# Altium footprint library LC-Standard-FootPrints-AD-V1.01.PcbLib: 585 footprints (part 1 of 37)
Each footprint in its own frame and in the unit in brackets; x right, y up, seen from the top. Pads: shape width x height; smd on the part's side, far side on the other; paste and mask are expansions set on the pad; w line width, h text height; cw(c..) or ccw(c..) is an arc to the next point about the centre after c.
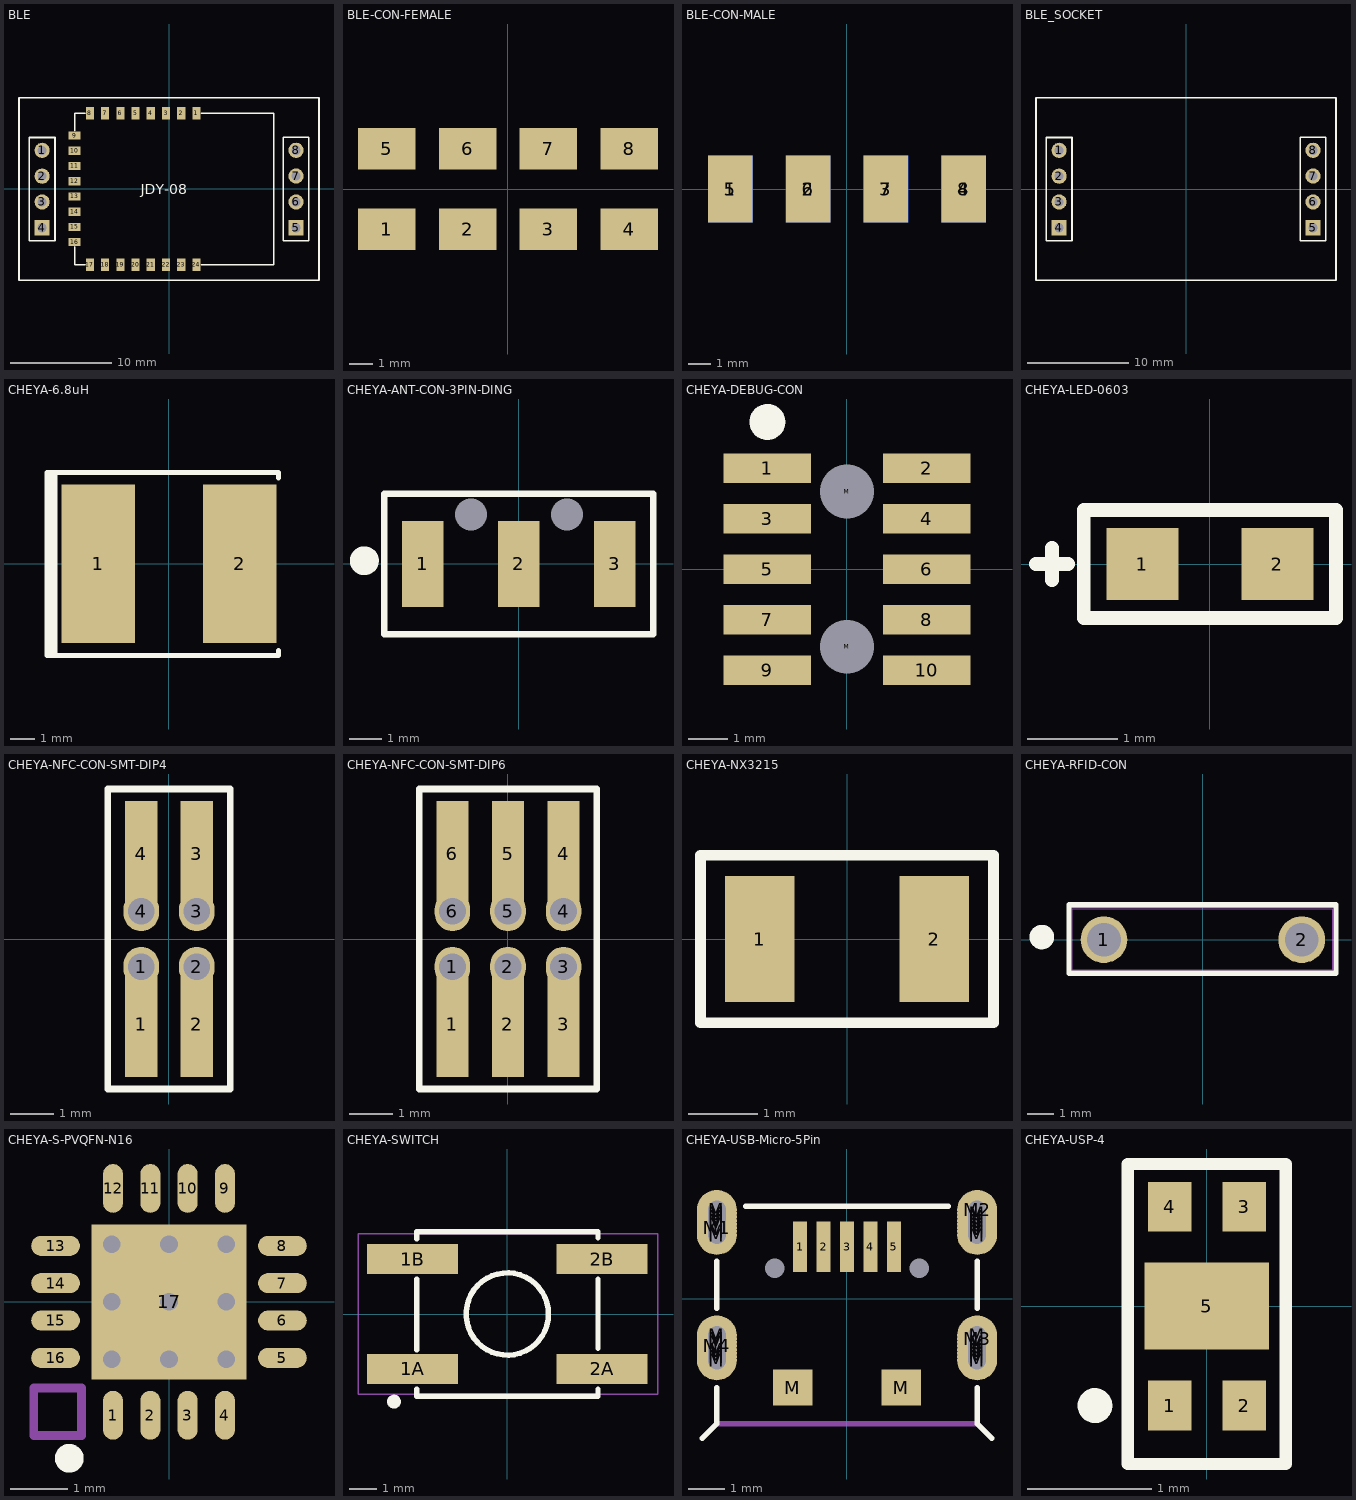
[diagram p0: the footprints below, top view; thin cyan lines are the x and y axes]

## BLE [mm]
pads (32):
  round 1.5 hole 0.9: 1(-12.504,3.804) 2(-12.504,1.264) 3(-12.504,-1.276) 6(12.504,-1.27) 7(12.504,1.27) 8(12.504,3.81)
  rect 0.8x1.2 smd: 1(2.696,7.468) 2(1.196,7.468) 3(-0.304,7.468) 4(-1.804,7.468) 5(-3.304,7.468) 6(-4.804,7.468) 7(-6.304,7.468) 8(-7.804,7.468) 17(-7.804,-7.468) 18(-6.304,-7.468) 19(-4.804,-7.468) 20(-3.304,-7.468) 21(-1.804,-7.468) 22(-0.304,-7.468) 23(1.196,-7.468) 24(2.696,-7.468)
  rect 1.5x1.5 hole 0.9: 4(-12.504,-3.816) 5(12.504,-3.81)
  rect 1.2x0.8 smd: 9(-9.304,5.265) 10(-9.304,3.765) 11(-9.304,2.265) 12(-9.304,0.765) 13(-9.304,-0.735) 14(-9.304,-2.235) 15(-9.304,-3.735) 16(-9.304,-5.235)
Top Overlay:
  lines w0.152: -14.781,-8.968 10.311,-8.968 14.723,-8.968 ; -14.781,-8.959 -14.781,5.074 -14.781,8.968 10.311,8.968 14.758,8.968 14.758,5.073 14.758,-8.968
  lines w0.16: -9.304,-5.709 -9.304,-7.468 -8.288,-7.468 ; -9.304,5.766 -9.304,7.468 -8.288,7.468 ; 3.162,-7.468 3.885,-7.468 10.311,-7.468 10.311,5.563 10.311,7.468 5.256,7.468 3.162,7.468 ; -13.781,-5.086 -13.781,5.074 -11.241,5.074 -11.241,-5.086 -13.781,-5.086 ; 11.226,-5.08 13.766,-5.08 13.766,5.08 11.226,5.08 11.226,-5.08
  text "JDY-08" at -2.804,-0.506 h1

## BLE-CON-FEMALE [mm]
pads (8):
  rect 2.5x1.8 smd: 1(-5.25,-1.75) 2(-1.75,-1.75) 3(1.75,-1.75) 4(5.25,-1.75) 5(-5.25,1.75) 6(-1.75,1.75) 7(1.75,1.75) 8(5.25,1.75)

## BLE-CON-MALE [mm]
pads (8):
  rect 2x3 smd: 1(-5.25,0) 2(-1.75,0) 3(1.75,0) 4(5.25,0)
  rect 2x3 smd far side: 5(-5.25,0) 6(-1.75,0) 7(1.75,0) 8(5.25,0)

## BLE_SOCKET [mm]
pads (8):
  round 1.5 hole 0.9: 1(-12.504,3.807) 2(-12.504,1.267) 3(-12.504,-1.273) 6(12.504,-1.267) 7(12.504,1.273) 8(12.504,3.813)
  rect 1.5x1.5 hole 0.9: 4(-12.504,-3.813) 5(12.504,-3.807)
Top Overlay:
  lines w0.16: -14.781,-8.965 10.311,-8.965 14.723,-8.965 ; -14.781,-8.957 -14.781,5.077 -14.781,8.97 10.311,8.97 14.758,8.97 14.758,5.076 14.758,-8.965 ; -13.781,-5.083 -13.781,5.077 -11.241,5.077 -11.241,-5.083 -13.781,-5.083 ; 11.226,-5.077 13.766,-5.077 13.766,5.083 11.226,5.083 11.226,-5.077

## CHEYA-6.8uH [mm]
pads (2):
  rect 3x6.5 smd: 1(-2.9,0) 2(2.9,0)
Top Overlay:
  lines w0.2: -4.826,-3.766 -4.826,3.683 ; -4.674,-3.766 -4.674,3.683 ; 4.496,-3.556 4.496,-3.766 -5.004,-3.766 -5.004,3.734 4.496,3.734 4.496,3.505
3D body: height 3, standoff 0, extent -3.43,-3.235 3.43,3.235

## CHEYA-ANT-CON-3PIN-DING [mm]
pads (5):
  rect 1.3x2.7 smd: 1(-3,0) 2(0,0) 3(3,0)
  round 0.2 hole 1 unplated: M(-1.5,1.55) M(1.5,1.55)
Top Overlay:
  circle w0.5: c-4.826,0.102 r0.2
  lines w0.2: -4.2,-2.2 -4.2,2.2 4.2,2.2 4.2,-2.2 -4.2,-2.2

## CHEYA-DEBUG-CON [mm]
pads (12):
  rect 2.2x0.74 smd: 1(-2,2.54) 2(2,2.54) 3(-2,1.27) 4(2,1.27) 5(-2,0) 6(2,0) 7(-2,-1.27) 8(2,-1.27) 9(-2,-2.54) 10(2,-2.54)
  round 0.2 hole 1.35 unplated: M(0,-1.95) M(0,1.95)
Top Overlay:
  circle w0.5: c-2,3.7 r0.2

## CHEYA-LED-0603 [mm]
pads (2):
  rect 0.8x0.8 smd: 1(-0.75,0) 2(0.75,0)
Top Overlay:
  lines w0.152: -1.93,0 -1.575,0 ; -1.753,-0.178 -1.753,0.178 ; -1.4,-0.6 -1.4,0 -1.4,0.6 0,0.6 1.4,0.6 1.4,0 1.4,-0.6 0,-0.6 -1.4,-0.6

## CHEYA-NFC-CON-SMT-DIP4 [mm]
pads (8):
  rect 0.74x2.4 smd paste-0.5: 1(-0.635,-1.95) 2(0.635,-1.95) 3(0.635,1.95) 4(-0.635,1.95)
  oval 0.813x0.914 hole 0.61: 1(-0.635,-0.635) 2(0.635,-0.635) 3(0.635,0.635) 4(-0.635,0.635)
Top Overlay:
  lines w0.152: -1.397,-3.429 -1.397,3.429 1.397,3.429 1.397,0.635 1.397,-0.635 1.397,-3.429 -1.397,-3.429
3D body: height 4.5, standoff 0, extent -1.3,-2.85 1.24,2.65

## CHEYA-NFC-CON-SMT-DIP6 [mm]
pads (12):
  rect 0.74x2.4 smd paste-0.5: 1(-1.27,-1.95) 2(0,-1.95) 3(1.27,-1.95) 4(1.27,1.95) 5(0,1.95) 6(-1.27,1.95)
  oval 0.813x0.914 hole 0.61: 1(-1.27,-0.635) 2(0,-0.635) 3(1.27,-0.635) 4(1.27,0.635) 5(0,0.635) 6(-1.27,0.635)
Top Overlay:
  lines w0.152: -2.032,-3.429 -2.032,3.429 2.032,3.429 2.032,-3.429 -2.032,-3.429
3D body: height 4.5, standoff 0, extent -1.905,-2.8 1.905,2.7

## CHEYA-NX3215 [mm]
pads (2):
  rect 1x1.8 smd: 1(-1.25,0) 2(1.25,0)
Top Overlay:
  lines w0.152: -2.1,-1.2 0,-1.2 2.1,-1.2 2.1,0 2.1,1.2 0,1.2 -2.1,1.2 -2.1,0 -2.1,-1.2

## CHEYA-RFID-CON [mm]
pads (2):
  round 1.8 hole 1.3: 1(-3.81,0) 2(3.81,0)
Top Overlay:
  circle w0.5: c-6.204,0.1 r0.224
  lines w0.2: -5.156,-1.295 -5.156,1.346 5.131,1.346 5.131,-1.295 -5.156,-1.295
Mechanical 19:
  lines w0.05: -5.1,-1.25 5.1,-1.25 5.1,1.25 -5.1,1.25 -5.1,-1.25
Mechanical 20:
  lines w0.025: -5.029,-1.168 5.004,-1.168 5.004,1.194 -5.029,1.194 -5.029,-1.168

## CHEYA-S-PVQFN-N16 [mm]
pads (17):
  oval 0.35x0.85 smd paste-0.025 mask+0.07: 1(-0.975,-1.975) 2(-0.325,-1.975) 3(0.325,-1.975) 4(0.975,-1.975) 9(0.975,1.975) 10(0.325,1.975) 11(-0.325,1.975) 12(-0.975,1.975)
  oval 0.85x0.35 smd paste-0.025 mask+0.07: 5(1.975,-0.975) 6(1.975,-0.325) 7(1.975,0.325) 8(1.975,0.975) 13(-1.975,0.975) 14(-1.975,0.325) 15(-1.975,-0.325) 16(-1.975,-0.975)
  rect 2.7x2.7 smd mask+0.07: 17(0,0)
via 1,-1 diameter 0.61 hole 0.305
via 0,-1 diameter 0.61 hole 0.305
via -1,-1 diameter 0.61 hole 0.305
via -1,0 diameter 0.61 hole 0.305
via -1,1 diameter 0.61 hole 0.305
via 0,1 diameter 0.61 hole 0.305
via 1,1 diameter 0.61 hole 0.305
via 1,0 diameter 0.61 hole 0.305
via 0,0 diameter 0.61 hole 0.305
Top Overlay:
  circle w0.3: c-1.737,-2.724 r0.1
Mechanical 7:
  lines w0.152: -2.354,-2.329 -2.354,-1.499 -1.524,-1.499 -1.524,-2.329 -2.354,-2.329
  text "NO ROUTING" at -7.535,-2.125 h0.5
3D body: height 0.92, standoff 0, extent -2,-2 2,2

## CHEYA-SWITCH [mm]
pads (4):
  rect 3.3x1.1 smd: 1A(-3.45,-2) 1B(-3.45,2) 2A(3.45,-2) 2B(3.45,2)
Top Overlay:
  circle w0.2: c0,0 r1.499
  circle w0.254: c-4.127,-3.191 r0.127
  lines w0.2: -3.302,-2.743 -3.302,-3 3.302,-3 3.302,-2.743 ; -3.302,-1.295 -3.302,1.27 ; -3.302,2.743 -3.302,3 3.302,3 3.302,2.769 ; 3.302,-1.245 3.302,1.27
Mechanical 19:
  lines w0.05: -5.41,2.921 -5.436,2.921 ; -5.436,2.921 -5.436,-2.921 5.486,-2.921 5.486,2.921 -5.436,2.921

## CHEYA-USB-Micro-5Pin [mm]
pads (41):
  rect 0.4x1.4 smd: 1(-1.3,1.44) 2(-0.65,1.44) 3(0,1.44) 4(0.65,1.44) 5(1.3,1.44)
  round 1.1 hole 0.5: M(-3.6,-1.71) M(-3.6,-1.61) M(-3.6,-1.51) M(-3.6,-1.41) M(-3.6,-1.21) M(-3.6,-1.11) M(-3.6,-1.01) M(-3.6,1.76) M(-3.6,1.86) M(-3.6,2.06) M(-3.6,2.16) M(-3.6,2.26) M(-3.6,2.36) M(-3.6,2.46) M(3.6,-1.71) M(3.6,-1.61) M(3.6,-1.51) M(3.6,-1.41) M(3.6,-1.31) M(3.6,-1.21) M(3.6,-1.01) M(3.6,1.76) M(3.6,1.86) M(3.6,1.96) M(3.6,2.06) M(3.6,2.16) M(3.6,2.26) M(3.6,2.36) M1(-3.6,1.96) M2(3.6,2.46) M3(3.6,-1.11) M4(-3.6,-1.31)
  round 0.2 hole 0.55 unplated: M(-2,0.84) M(2,0.84)
  rect 1.1x1 smd: M(-1.5,-2.46) M(1.5,-2.46)
Top Overlay:
  lines w0.152: -4,-3.86 -3.6,-3.46 -3.6,-2.46 ; -3.6,-0.26 -3.6,1.04 ; -2.8,2.56 2.8,2.56 ; 3.6,-2.46 3.6,-3.46 4,-3.86 ; 3.6,-0.26 3.6,1.04
Mechanical 13:
  lines w0.152: -3.6,-3.46 3.6,-3.46
3D body: height 2.68, standoff -0.63, extent -4.085,-3.934 4.115,1.496

## CHEYA-USP-4 [mm]
pads (5):
  rect 0.35x0.4 smd paste+0 mask+0.04: 1(-0.3,-0.8) 2(0.3,-0.8) 3(0.3,0.8) 4(-0.3,0.8)
  rect 1x0.7 smd paste+0 mask+0.04: 5(0,0)
Top Overlay:
  circle w0.14: c-0.9,-0.8 r0.07
  lines w0.1: -0.635,-1.27 0.635,-1.27 0.635,1.143 -0.635,1.143 -0.635,-1.27